# Altium footprint library thu vien thong.PcbLib: 106 footprints (part 6 of 7)
Each footprint in its own frame and in the unit in brackets; x right, y up, seen from the top. Pads: shape width x height; smd on the part's side, far side on the other; paste and mask are expansions set on the pad; w line width, h text height; cw(c..) or ccw(c..) is an arc to the next point about the centre after c.
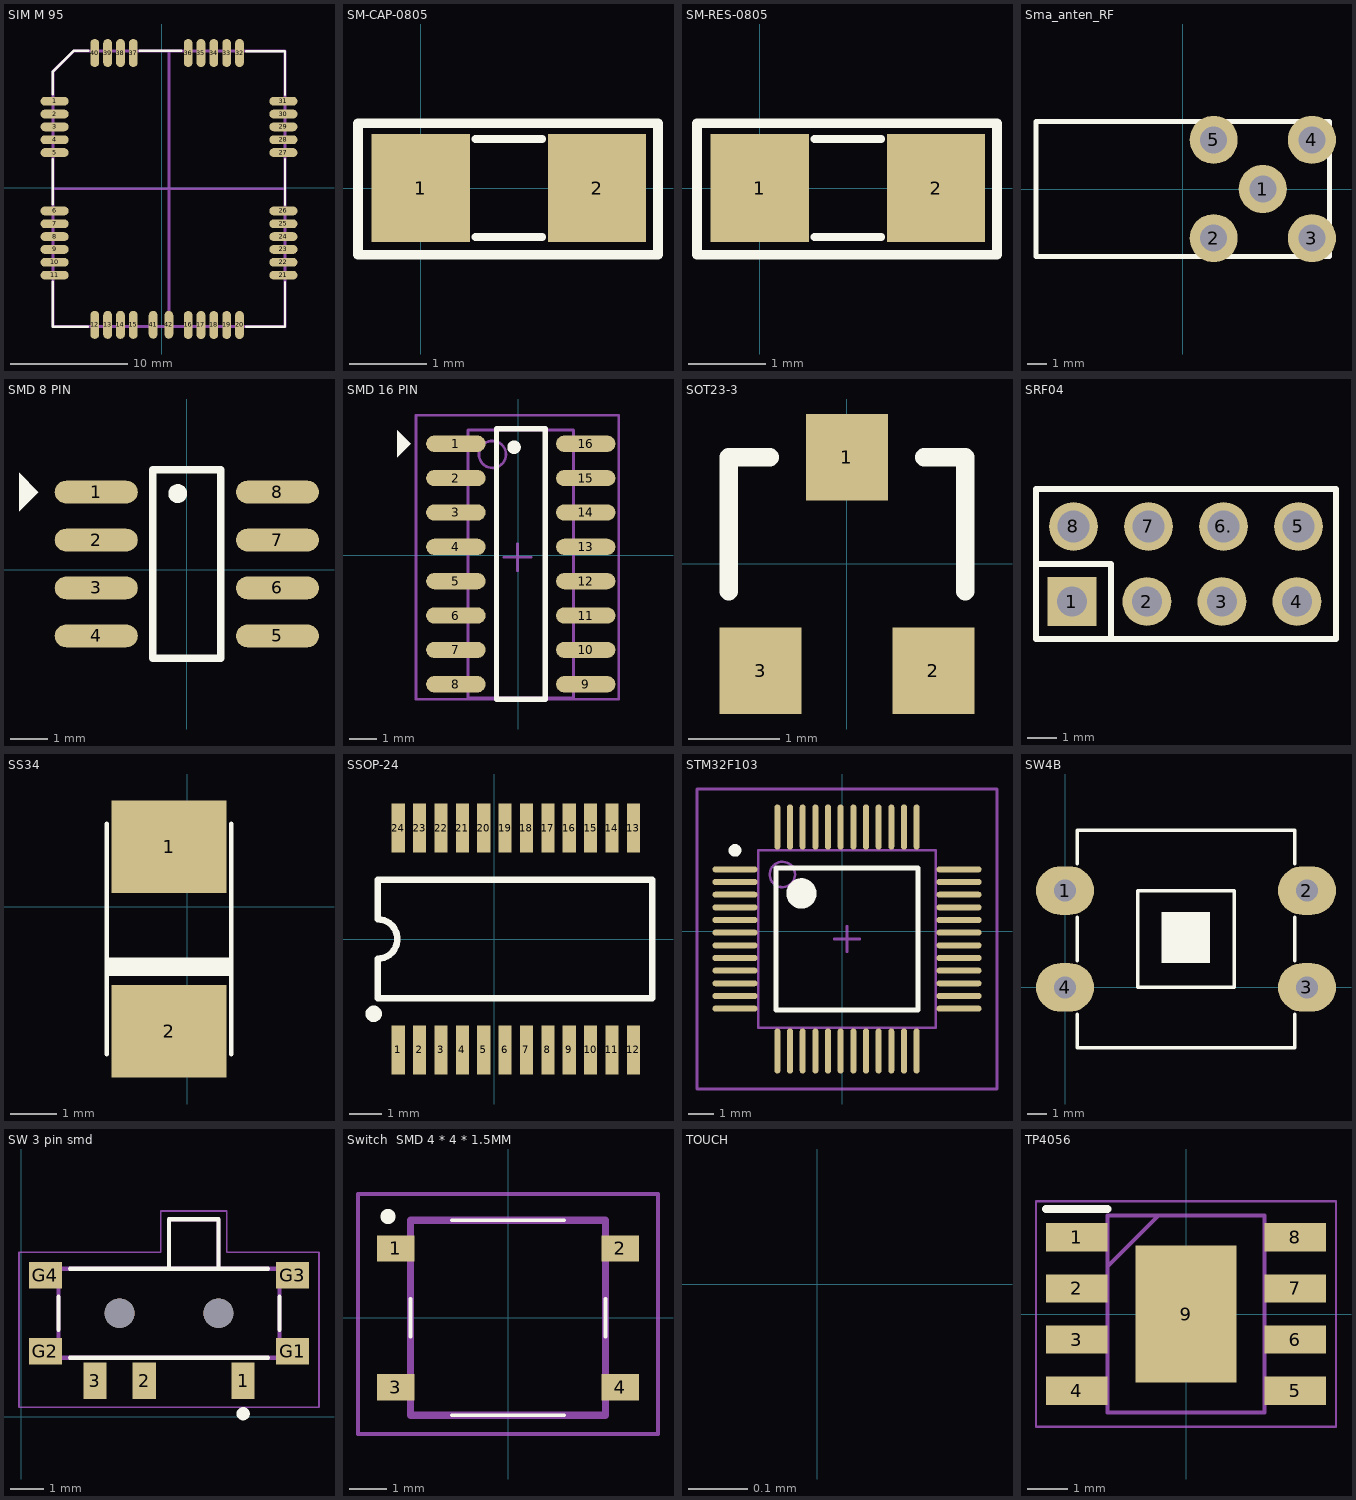
[diagram p5: the footprints below, top view; thin cyan lines are the x and y axes]

## SIM M 95 [mm]
pads (42):
  oval 2.4x0.75 smd: 1(-9.179,7.413) 2(-9.179,6.313) 3(-9.179,5.213) 4(-9.179,4.113) 5(-9.179,3.013) 6(-9.179,-1.987) 7(-9.179,-3.087) 8(-9.179,-4.187) 9(-9.179,-5.287) 10(-9.179,-6.387) 11(-9.179,-7.487) 21(10.421,-7.487) 22(10.421,-6.387) 23(10.421,-5.287) 24(10.421,-4.187) 25(10.421,-3.087) 26(10.421,-1.987) 27(10.421,3.013) 28(10.421,4.113) 29(10.421,5.213) 30(10.421,6.313) 31(10.421,7.413)
  oval 0.75x2.4 smd: 12(-5.739,-11.747) 13(-4.639,-11.747) 14(-3.539,-11.747) 15(-2.439,-11.747) 16(2.261,-11.757) 17(3.361,-11.757) 18(4.461,-11.757) 19(5.561,-11.757) 20(6.661,-11.757) 32(6.661,11.543) 33(5.561,11.543) 34(4.461,11.543) 35(3.361,11.543) 36(2.261,11.543) 37(-2.439,11.543) 38(-3.539,11.543) 39(-4.639,11.543) 40(-5.739,11.543) 41(-0.739,-11.737) 42(0.611,-11.737)
Top Overlay:
  lines w0.203: -9.329,-8.062 -9.329,-11.897 -6.332,-11.897 ; -9.329,-1.407 -9.329,2.429 ; -9.329,8.017 -9.329,9.947 -7.551,11.725 -6.306,11.725 ; -1.887,11.725 1.695,11.725 ; 7.232,-11.897 10.559,-11.897 10.559,-8.087 ; 7.232,11.7 10.559,11.7 10.559,7.94 ; 10.559,-1.458 10.559,2.454
Mechanical 1:
  lines w0.254: -9.329,-0.087 10.571,-0.087 ; 0.611,10.883 0.616,10.878 ; 0.616,-11.897 0.616,11.708 ; -9.329,-11.897 -9.329,9.933 -7.549,11.713 10.571,11.713 10.571,-11.887 10.561,-11.897 -9.329,-11.897 ; -8.004,-0.087 -8.004,-0.087

## SM-CAP-0805 [mil]
pads (2):
  rect 50x55 smd: 1(0,0) 2(90,0)
Top Overlay:
  lines w4: 28,-25 62,-25 ; 28,25 62,25
  lines w5: -32,-34 121,-34 121,33 -32,33 -32,-34
3D body "0805 SMD Capacitor.step": height 31.39, standoff 0.6, extent 5.64,-24.6 84.37,24.61

## SM-RES-0805 [mil]
pads (2):
  rect 50x55 smd: 1(0,0) 2(90,0)
Top Overlay:
  lines w4: 28,-25 62,-25 ; 28,25 62,25
  lines w5: -32,-34 121,-34 121,33 -32,33 -32,-34
3D body "SW3dPS-0805 SMD Resistor.STEP": height 31.39, standoff 0.6, extent 5.64,-24.6 84.38,24.61

## Sma_anten_RF [mm] "Sim28"
height 9.65
pads (5):
  round 2.5 hole 1.4: 1(4.15,0) 2(1.6,-2.55) 3(6.7,-2.55) 4(6.7,2.55) 5(1.6,2.55)
Top Overlay:
  lines w0.254: -7.62,-3.2 -7.62,3.2 ; -7.62,-2.9 -7.62,-3.5 7.62,-3.5 7.62,-2.9 ; -7.62,2.8 -7.62,3.5 7.62,3.5 7.62,3 ; 7.62,-3.2 7.62,3.2

## SMD 8 PIN [mm]
pads (8):
  oval 2.2x0.6 smd: 1(-2.4,2.057) 2(-2.4,0.787) 3(-2.4,-0.483) 4(-2.4,-1.753) 5(2.4,-1.753) 6(2.4,-0.483) 7(2.4,0.787) 8(2.4,2.057)
Top Overlay:
  circle w0.25: c-0.241,2.018 r0.125
  region: -4.445,1.549 -3.937,2.057 -4.445,2.565
  lines w0.2: -0.9,-2.348 -0.9,2.652 0.9,2.652 0.9,-2.348 -0.9,-2.348
3D body "User Library-SOIC-8.STEP": height 1.75, standoff 0, extent -2.93,-2.358 3.082,2.642

## SMD 16 PIN [mm]
pads (16):
  oval 2.2x0.6 smd: 1(-2.298,4.115) 2(-2.298,2.845) 3(-2.298,1.575) 4(-2.298,0.305) 5(-2.298,-0.965) 6(-2.298,-2.235) 7(-2.298,-3.505) 8(-2.298,-4.775) 9(2.502,-4.775) 10(2.502,-3.505) 11(2.502,-2.235) 12(2.502,-0.965) 13(2.502,0.305) 14(2.502,1.575) 15(2.502,2.845) 16(2.502,4.115)
Top Overlay:
  circle w0.25: c-0.15,3.988 r0.125
  region: -4.47,3.607 -3.962,4.115 -4.47,4.623
  lines w0.2: -0.798,-5.33 -0.798,4.67 1.002,4.67 1.002,-5.33 -0.798,-5.33
Mechanical 13:
  circle w0.1: c-0.948,3.72 r0.5
  lines w0.1: -1.848,-5.28 -1.848,4.62 2.052,4.62 2.052,-5.28 -1.848,-5.28
Mechanical 15:
  lines w0.1: -0.525,-0.076 0.475,-0.076 ; -0.025,-0.576 -0.025,0.424 ; -3.775,-5.326 -3.775,5.174 3.725,5.174 3.725,-5.326 -3.775,-5.326

## SOT23-3 [mm] "SOT-23; 3 Leads; Body 3.1 x 2.5 mm, inc. leads (LxW max)"
height 1.1
pads (3):
  rect 0.9x0.95 smd: 1(0,1.175) 2(0.95,-1.175) 3(-0.95,-1.175)
Top Overlay:
  lines w0.2: -1.3,-0.3 -1.3,1.175 -0.85,1.175 ; 0.85,1.175 1.3,1.175 1.3,-0.3
3D body "SW3DPS-SOT-23-DEFAULT.step": height 1.08, standoff -0.02, extent -1.5,-1.25 1.5,1.25

## SRF04 [mil]
pads (8):
  rect 65x65 hole 40.16: 1(12904.88,29462.68)
  round 65 hole 40.16: 2(13004.88,29462.68) 3(13104.88,29462.68) 4(13204.88,29462.68)
  round 65 hole 43.31: 5(13207.05,29562.72) 6.(13107.05,29562.72) 7(13007.05,29562.72) 8(12907.05,29562.72)
Top Overlay:
  lines w7.87: 12857.05,29512.72 12957.05,29512.72 12957.05,29412.72 ; 12857.05,29412.72 13257.05,29412.72 13257.05,29612.72 12857.05,29612.72 12857.05,29412.72
3D body "61300821121.stp": height 336.61, standoff -117.72, extent 12857.05,29412.72 13257.05,29612.72
3D body "User Library-HC-SR04.STEP": height 1122.05, standoff 130.71, extent 12179.05,29452.68 13950.71,30164.03
3D body "61300411821.stp": height 335.04, standoff -121.65, extent 12845.05,29413.47 13264.73,29511.9

## SS34 [mm] "Diode, Axial; Body 5.2 x 2.7 mm (LxDia. max), Lead Dia. 0.86 mm (max)"
height 2.8
pads (2):
  rect 2.5x2 smd: 1(-0.4,1.3) 2(-0.4,-2.7)
Top Overlay:
  region: -1.801,-1.1 -1.801,-1.5 0.899,-1.5 0.899,-1.1
  lines w0.1: -1.75,-3.2 -1.75,1.8 ; 0.95,-3.2 0.95,1.8
3D body "SW3DPS-DIOD SMD 10BF10-DEFAULT.STEP": height 2.45, standoff 0.02, extent -2.2,-3.35 1.4,1.95

## SSOP-24 [mm] "SSOP, Plastic; 20 Leads; Body Width 5.3 mm; Pitch 0.65 mm"
height 1.99
pads (24):
  rect 0.4x1.5 smd: 1(-2.925,-3.375) 2(-2.275,-3.375) 3(-1.625,-3.375) 4(-0.975,-3.375) 5(-0.325,-3.375) 6(0.325,-3.375) 7(0.975,-3.375) 8(1.625,-3.375) 9(2.275,-3.375) 10(2.925,-3.375) 11(3.575,-3.375) 12(4.225,-3.375) 13(4.225,3.375) 14(3.575,3.375) 15(2.925,3.375) 16(2.275,3.375) 17(1.625,3.375) 18(0.975,3.375) 19(0.325,3.375) 20(-0.325,3.375) 21(-0.975,3.375) 22(-1.625,3.375) 23(-2.275,3.375) 24(-2.925,3.375)
Top Overlay:
  circle w0.25: c-3.675,-2.275 r0.125
  lines w0.2: -3.55,-1.8 -3.55,-0.6 ccw(c-3.55,0) -3.55,0.6 -3.55,1.8 4.8,1.8 4.8,-1.8 -3.55,-1.8
3D body "SSOP24.STEP": height 1.85, standoff -0.05, extent -3.45,-3.8 4.782,3.75

## STM32F103 [mm]
pads (48):
  oval 1.778x0.24 smd: 1(-4.228,2.445) 2(-4.228,1.945) 3(-4.228,1.445) 4(-4.228,0.945) 5(-4.228,0.445) 6(-4.228,-0.055) 7(-4.228,-0.555) 8(-4.228,-1.055) 9(-4.228,-1.555) 10(-4.228,-2.055) 11(-4.228,-2.555) 12(-4.228,-3.055) 25(4.622,-3.055) 26(4.622,-2.555) 27(4.622,-2.055) 28(4.622,-1.555) 29(4.622,-1.055) 30(4.622,-0.555) 31(4.622,-0.055) 32(4.622,0.445) 33(4.622,0.945) 34(4.622,1.445) 35(4.622,1.945) 36(4.622,2.445)
  oval 0.24x1.778 smd: 13(-2.553,-4.73) 14(-2.053,-4.73) 15(-1.553,-4.73) 16(-1.053,-4.73) 17(-0.553,-4.73) 18(-0.053,-4.73) 19(0.447,-4.73) 20(0.947,-4.73) 21(1.447,-4.73) 22(1.947,-4.73) 23(2.447,-4.73) 24(2.947,-4.73) 37(2.947,4.12) 38(2.447,4.12) 39(1.947,4.12) 40(1.447,4.12) 41(0.947,4.12) 42(0.447,4.12) 43(-0.053,4.12) 44(-0.553,4.12) 45(-1.053,4.12) 46(-1.553,4.12) 47(-2.053,4.12) 48(-2.553,4.12)
Top Overlay:
  circle w0.6: c-1.603,1.495 r0.3
  circle w0.25: c-4.228,3.195 r0.125
  lines w0.2: -2.603,-3.105 2.997,-3.105 2.997,2.495 -2.603,2.495 -2.603,-3.105
Mechanical 13:
  circle w0.1: c-2.353,2.245 r0.5
  lines w0.1: -3.303,-3.805 3.697,-3.805 3.697,3.195 -3.303,3.195 -3.303,-3.805
Mechanical 15:
  lines w0.1: -0.303,-0.305 0.697,-0.305 ; 0.197,-0.805 0.197,0.195 ; -5.728,-6.23 6.122,-6.23 6.122,5.62 -5.728,5.62 -5.728,-6.23
3D body "User Library-TQFP48.STEP": height 1.1, standoff 0, extent -4.343,-4.804 4.674,4.214

## SW4B [mil] "SW button 4pin, 450 x 450 mil"
height 100
pads (4):
  oval 120x100 hole 45: 1(0,200) 2(500,200) 3(500,0) 4(0,0)
Top Overlay:
  rectangle: 199,50 300,156
  lines w7: 25,-55 25,-125 475,-125 475,-55 ; 25,55 25,145 ; 25,255 25,325 475,325 475,255 ; 475,55 475,145 ; 150,0 350,0 350,200 150,200 150,0
3D body "SW3dPS-omron b3w-4000 switch.STEP": height 169.29, standoff -57.09, extent -3.21,-129.22 469.23,343.23

## SW 3 pin smd [mm]
pads (9):
  rect 0.7x1.1 smd: 1(6.731,1.095) 2(3.731,1.095) 3(2.231,1.095)
  rect 1x0.8 smd: G1(8.231,1.995) G2(0.731,1.995) G3(8.231,4.295) G4(0.731,4.295)
  round 0.9 hole 0.9 unplated: ""(2.981,3.145) ""(5.981,3.145)
Top Overlay:
  circle w0.2: c6.731,0.095 r0.1
  lines w0.127: 1.131,2.645 1.131,3.645 ; 1.481,1.795 7.481,1.795 ; 1.481,4.495 7.481,4.495 ; 4.481,4.495 4.481,5.995 5.981,5.995 5.981,4.495 ; 7.831,2.645 7.831,3.645
Mechanical 13:
  lines w0.127: 4.481,4.495 4.481,5.995 5.981,5.995 5.981,4.495 ; 1.131,1.795 7.831,1.795 7.831,4.495 1.131,4.495 1.131,1.795
Mechanical 15:
  lines w0.05: -0.069,0.295 -0.069,4.995 4.231,4.995 4.231,6.245 6.231,6.245 6.231,4.995 9.031,4.995 9.031,0.295 -0.069,0.295
3D body "1437575-2.stp": height 1.4, standoff -0.5, extent 0.631,0.953 8.331,6.042

## Switch  SMD 4 * 4 * 1.5MM [mm]
pads (4):
  rect 1x0.7 smd: 1(-3,1.85) 2(3,1.85) 3(-3,-1.85) 4(3,-1.85)
Top Overlay:
  lines w0.1: -2.6,-0.5 -2.6,0.5 ; -1.5,-2.6 1.5,-2.6 ; -1.5,2.6 1.5,2.6 ; 2.6,-0.5 2.6,0.5
  lines w0.2: -3.2,2.6 cw(c-3.2,2.7) -3.2,2.8 cw(c-3.2,2.7) -3.2,2.6
Mechanical 13:
  lines w0.2: -2.6,-2.6 2.6,-2.6 2.6,2.6 -2.6,2.6 -2.6,-2.6
Mechanical 15:
  lines w0.1: -4,-3.1 4,-3.1 4,3.3 -4,3.3 -4,-3.1
3D body "PTS526_SM15_SMTR2_LFS.stp": height 1.55, standoff 0, extent -3.2,-2.6 3.2,2.6

## TOUCH [mm]
pads (1):
  round 0 / inner rrect10% 10x5 / far side rrect10% 10x5 all layers, no hole: 1(0.05,-0.05)

## TP4056 [mm]
pads (9):
  rect 1.525x0.7 smd: 1(-2.712,1.905) 2(-2.712,0.635) 3(-2.712,-0.635) 4(-2.712,-1.905) 5(2.712,-1.905) 6(2.712,-0.635) 7(2.712,0.635) 8(2.712,1.905)
  rect 2.513x3.402 smd: 9(0,0)
Top Overlay:
  lines w0.2: -3.475,2.605 -1.95,2.605
Mechanical 13:
  lines w0.1: -1.95,1.18 -0.68,2.45 ; -1.95,-2.45 1.95,-2.45 1.95,2.45 -1.95,2.45 -1.95,-2.45
Mechanical 15:
  lines w0.05: -3.725,-2.8 3.725,-2.8 3.725,2.8 -3.725,2.8 -3.725,-2.8
3D body "TP4056.stp": height 1.75, standoff 0, extent -3,-2.45 3,2.45